# Altium footprint library THU VIEN V1.PcbLib: 400 footprints (part 20 of 25)
Each footprint in its own frame and in the unit in brackets; x right, y up, seen from the top. Pads: shape width x height; smd on the part's side, far side on the other; paste and mask are expansions set on the pad; w line width, h text height; cw(c..) or ccw(c..) is an arc to the next point about the centre after c.
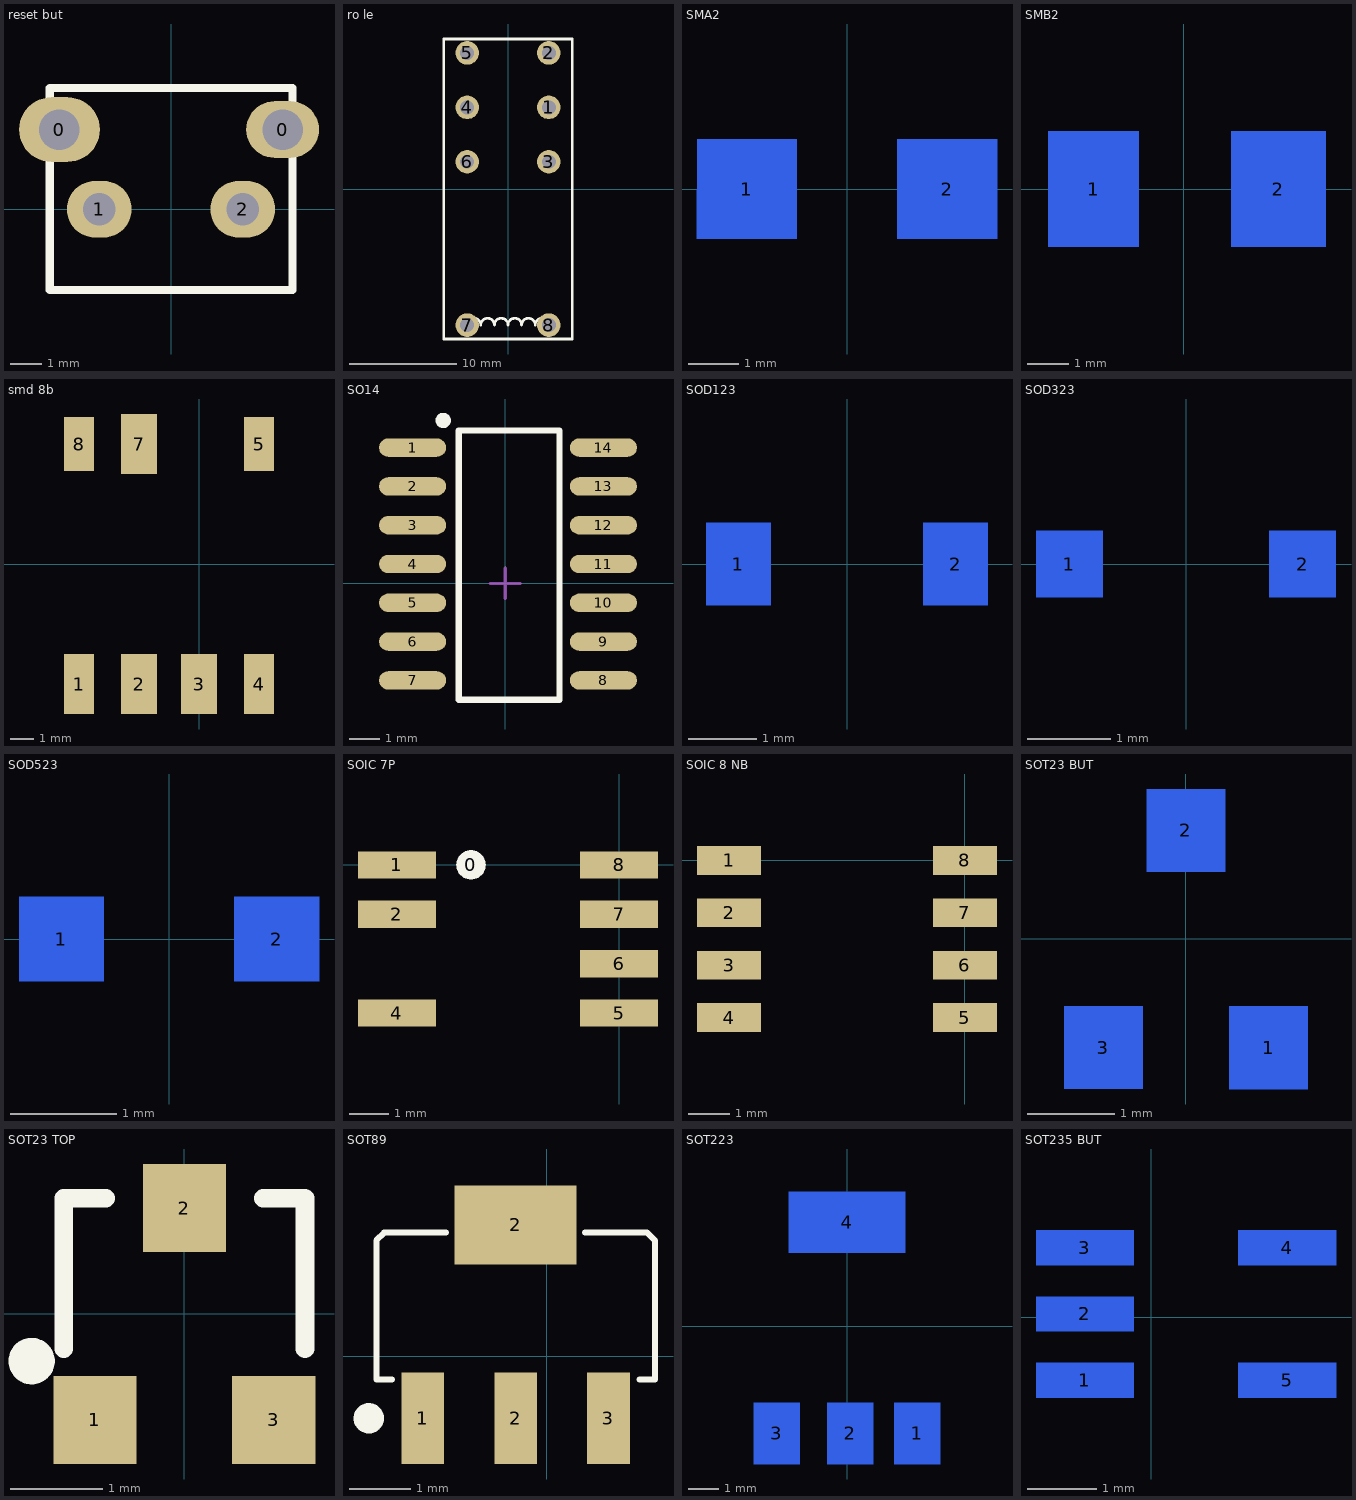
[diagram p19: the footprints below, top view; thin cyan lines are the x and y axes]

## reset but [mil]
pads (4):
  oval 100x80 hole 50: 0(-137.8,98.43)
  oval 90x70 hole 50: 0(137.8,98.43)
  oval 80x70 hole 40: 1(-88.58,0) 2(88.58,0)
Top Overlay:
  lines w10: -149.84,-100 -149.84,150 150.16,150 150.16,-100 -149.84,-100
Bottom Overlay:
  lines w3: 0,-98.43 0,147.64
3D body: height 291.34, standoff -137.8, extent -171.26,-124.01 171.27,157.49

## ro le [mm]
pads (8):
  round 2.2 hole 1.3: 1(3.81,7.62) 2(3.81,12.7) 3(3.81,2.54) 4(-3.81,7.62) 5(-3.81,12.7) 6(-3.81,2.54) 7(-3.81,-12.7) 8(3.81,-12.7)
Top Overlay:
  lines w0.254: -3.81,-12.7 cw(c-3.175,-12.7) -2.54,-12.7 cw(c-1.905,-12.7) -1.27,-12.7 cw(c-0.635,-12.7) 0,-12.7 cw(c0.635,-12.7) 1.27,-12.7 cw(c1.905,-12.7) 2.54,-12.7 cw(c3.175,-12.7) 3.81,-12.7 ; -6,-14 -6,14 6,14 6,-14 -6,-14
3D body: height 25.53, standoff -4.44, extent -6.388,-14.707 6.337,14.249

## SMA2 [mm]
pads (2):
  rect 2x2 smd far side: 1(-2.016,0) 2(2,0)
Bottom Overlay:
  lines w0.05: -1,-1 -1,1 ; 1,-1 1,1 ; -3,-1 3,-1 3,1 -3,1 -3,-1
3D body: height -0.43, standoff -2.57, extent -2.553,-1.334 2.553,1.333

## SMB2 [mm]
pads (2):
  rect 2.2x2.8 smd far side: 1(-2.2,0)
  rect 2.3x2.8 smd far side: 2(2.3,0)
Bottom Overlay:
  lines w0.05: -1.1,-1.4 -1.1,1.4 ; 1.1,-1.4 1.1,1.4 ; -3.3,-1.4 -3.3,1.4 3.5,1.4 3.5,-1.4 -3.3,-1.4
3D body: height -0.4, standoff -2.7, extent -2.6,-1.8 2.8,1.8

## smd 8b [mil]
pads (7):
  rect 50x100 smd: 1(-200,-200) 4(100,-200)
  rect 60x100 smd: 2(-100,-200) 3(0,-200) 7(-100,200)
  rect 50x90 smd: 5(100,200) 8(-200,200)
3D body: height 200, standoff 0, extent -240.16,-202.76 150,202.76

## SO14 [mm] "SOIC, 16-Leads, Body 9.9x3.9mm, Pitch 1.27mm, IPC Medium Density"
height 1.75
pads (14):
  oval 2.2x0.6 smd: 1(-3.035,4.445) 2(-3.035,3.175) 3(-3.035,1.905) 4(-3.035,0.635) 5(-3.035,-0.635) 6(-3.035,-1.905) 7(-3.035,-3.175) 8(3.214,-3.175) 9(3.214,-1.905) 10(3.214,-0.635) 11(3.214,0.635) 12(3.214,1.905) 13(3.214,3.175) 14(3.214,4.445)
Top Overlay:
  circle w0.25: c-2.03,5.334 r0.125
  lines w0.2: -1.524,-3.81 1.778,-3.81 1.778,5 -1.524,5 -1.524,-3.81
Mechanical 15:
  lines w0.1: -0.5,0 0.5,0 ; 0,-0.5 0,0.5
3D body: height 1.56, standoff -0.03, extent -3.123,-3.666 3.123,4.936

## SOD123 [mm]
pads (2):
  rect 0.95x1.22 smd far side: 1(-1.6,0) 2(1.6,0)
Bottom Overlay:
  lines w0.05: -1.1,-0.6 -1.099,0.6 ; 1.1,-0.6 1.101,0.6 ; -2.1,-0.6 2.1,-0.6 2.1,0.6 -2.1,0.6 -2.1,-0.6
3D body: height -0.41, standoff -1.68, extent -1.85,-0.8 1.85,0.8

## SOD323 [mm]
pads (2):
  rect 0.8x0.8 smd far side: 1(-1.4,0) 2(1.4,0)
Bottom Overlay:
  lines w0.05: -0.972,-0.4 -0.972,0.4 ; 0.974,-0.4 0.974,0.4 ; -1.778,-0.4 -1.778,0.398 1.778,0.398 1.778,-0.4 -1.778,-0.4
  lines w0.254: 0.635,-0.254 0.635,0.254
3D body: height -0.41, standoff -1.51, extent -1.3,-0.675 1.3,0.675

## SOD523 [mm]
pads (2):
  rect 0.8x0.8 smd far side: 1(-1.016,0) 2(1.016,0)
Bottom Overlay:
  lines w0.05: -1.4,-0.4 1.4,-0.4 ; -1.4,0.398 1.4,0.398 ; -1.399,-0.4 -1.399,0.4 ; -0.599,-0.4 -0.599,0.4 ; 0.601,-0.4 0.601,0.4 ; 1.401,-0.4 1.401,0.4
3D body: height -0.41, standoff -1.11, extent -0.8,-0.399 0.8,0.399

## SOIC 7P [mm]
pads (8):
  round 0.762 on Top Overlay: 0(-3.81,0)
  rect 2x0.7 smd: 1(-5.715,0) 2(-5.715,-1.27) 4(-5.715,-3.81) 5(0,-3.81) 6(0,-2.54) 7(0,-1.27) 8(0,0)
3D body: height -0.5, standoff -2.25, extent -5.825,-4.405 0.186,0.595

## SOIC 8 NB [mm]
pads (8):
  rect 1.55x0.7 smd: 1(-5.715,0) 2(-5.715,-1.27) 3(-5.715,-2.54) 4(-5.715,-3.81) 5(0,-3.81) 6(0,-2.54) 7(0,-1.27) 8(0,0)
3D body: height -0.5, standoff -2.25, extent -5.825,-4.405 0.186,0.595

## SOT23 BUT [mm]
pads (3):
  rect 0.9x0.95 smd far side: 1(0.95,-1.25) 2(0,1.25) 3(-0.95,-1.25)
Bottom Overlay:
  circle w0.25: c0.891,-0.508 r0.125
  lines w0.2: -1.3,-0.375 -1.3,1.25 -0.85,1.25 ; 0.85,1.25 1.3,1.25 1.3,-0.375
3D body: height -0.38, standoff -1.38, extent -1.46,-1.17 1.46,1.17

## SOT23 TOP [mm]
pads (3):
  rect 0.9x0.95 smd: 1(-0.965,-1.143) 2(0,1.143) 3(0.965,-1.143)
Top Overlay:
  circle w0.25: c-1.649,-0.508 r0.125
  lines w0.2: -1.3,-0.375 -1.3,1.25 -0.85,1.25 ; 0.85,1.25 1.3,1.25 1.3,-0.375
3D body: height 1, standoff 0, extent -1.46,-1.17 1.46,1.17

## SOT89 [mm]
pads (4):
  rect 0.7x1.5 smd: 1(-2.032,-1.016) 2(-0.508,-1.016) 3(1.016,-1.016)
  rect 2x1.3 smd: 2(-0.508,2.159)
Top Overlay:
  circle w0.25: c-2.919,-1.016 r0.125
  lines w0.1: -2.54,-0.381 -2.794,-0.381 -2.794,1.905 -2.667,2.032 -1.651,2.032 ; 0.635,2.032 1.651,2.032 1.778,1.905 1.778,-0.381 1.524,-0.381
3D body: height 1.4, standoff 0, extent -2.758,-1.423 1.742,2.512

## SOT223 [mm]
pads (4):
  rect 1.5x2 smd far side: 1(2.3,-3.5) 2(0.1,-3.5) 3(-2.3,-3.5)
  rect 3.8x2 smd far side: 4(0,3.4)
Bottom Overlay:
  lines w0.254: -3.3,-2.5 -3.3,2.4 3.3,2.4 3.3,-2.5 -3.3,-2.5
3D body: height 1.74, standoff 0.06, extent -3.25,-3.48 3.25,3.48

## SOT235 BUT [mm]
pads (5):
  rect 1.4x0.5 smd far side: 1(-0.95,-0.9) 2(-0.95,0.05) 3(-0.95,1) 4(1.95,1) 5(1.95,-0.9)
3D body: height -0.38, standoff -1.68, extent -1,-1.45 2,1.55